# Altium footprint library nodemcu.PcbLib: 1 footprints
Each footprint in its own frame and in the unit in brackets; x right, y up, seen from the top. Pads: shape width x height; smd on the part's side, far side on the other; paste and mask are expansions set on the pad; w line width, h text height; cw(c..) or ccw(c..) is an arc to the next point about the centre after c.
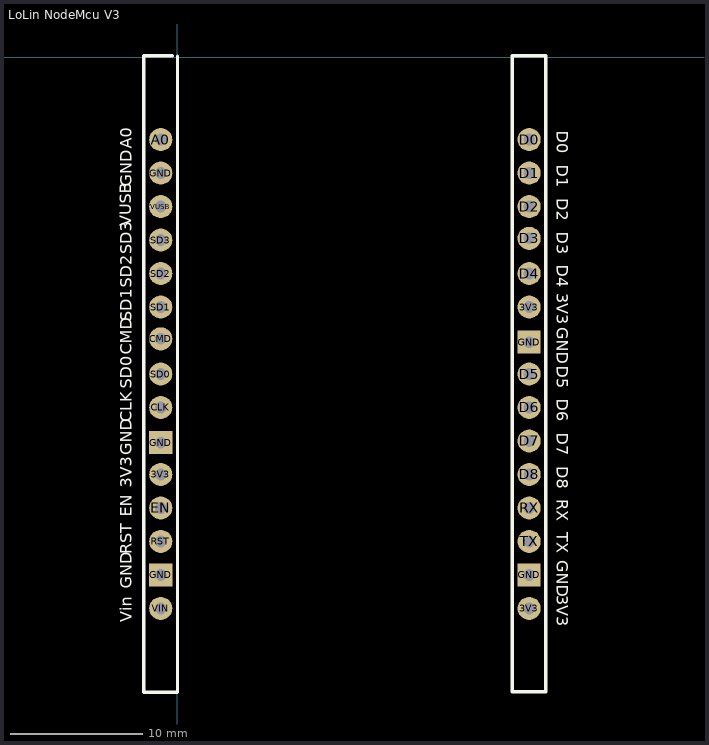
[diagram p0: the footprint, top view; thin cyan lines are the x and y axes]

## LoLin NodeMcu V3 [mil]
pads (30):
  round 69 hole 35: 3V3(-49,-1246) 3V3(1051,-1646) 3V3(1051,-746) A0(-49,-246) CLK(-49,-1046) CMD(-49,-841) D0(1051,-246) D1(1051,-346) D2(1051,-446) D3(1051,-541) D4(1051,-646) D5(1051,-946) D6(1051,-1046) D7(1051,-1146) D8(1051,-1246) EN(-49,-1346) GND(-49,-346) RST(-49,-1446) RX(1051,-1346) SD0(-49,-946) SD1(-49,-746) SD2(-49,-646) SD3(-49,-546) TX(1051,-1446) VIN(-49,-1646) VUSB(-49,-446)
  rect 69x69 hole 35: GND(-49,-1546) GND(-49,-1151) GND(1051,-1546) GND(1051,-851)
Top Overlay:
  lines w10: -14,4 -100,4 -100,-80 -100,-1810 -100,-1896 1,-1896 1,2.78 ; 1100,-1895 1000,-1895 1000,4 1100,4 ; 1101,-1895 1101,-1806 1101,-86 1101,4
  text "GND" at -124,-1188 h60
  text "3V3" at -124,-1285 h60
  text "EN" at -124,-1372 h60
  text "RST" at -124,-1484 h60
  text "GND" at -124,-1587 h60
  text "Vin" at -124,-1687 h60
  text "D7" at 1121,-1121.23 h60
  text "D8" at 1121,-1221.11 h60
  text "RX" at 1121,-1320.06 h60
  text "TX" at 1121,-1419 h60
  text "GND" at 1121,-1502.2 h60
  text "3V3" at 1121,-1606 h60
  text "D6" at 1121,-1020.12 h60
  text "CMD" at -124,-889.14 h60
  text "D0" at 1121,-220 h60
  text "D1" at 1121,-321.35 h60
  text "D2" at 1121,-421.58 h60
  text "D3" at 1121,-521.58 h60
  text "D4" at 1121,-620 h60
  text "3V3" at 1121,-705.01 h60
  text "GND" at 1121,-807 h60
  text "D5" at 1121,-921 h60
  text "A0" at -124,-273 h60
  text "GND" at -124,-387 h60
  text "VUSB" at -125,-505 h60
  text "SD3" at -124,-587.86 h60
  text "SD2" at -124,-688.29 h60
  text "SD1" at -124,-788.71 h60
  text "SD0" at -124,-989.57 h60
  text "CLK" at -124,-1090 h60
3D body "Lolin NodeMCU ESP8266 V3.STEP": height 516.1, standoff -1.22, extent -120.08,-2164.01 1120.08,197.4